# Altium schematic symbol library 724452_RPL-HX_Mobile_AEP_Rev0p91_Library.SchLib: 162 symbols (part 4 of 5)
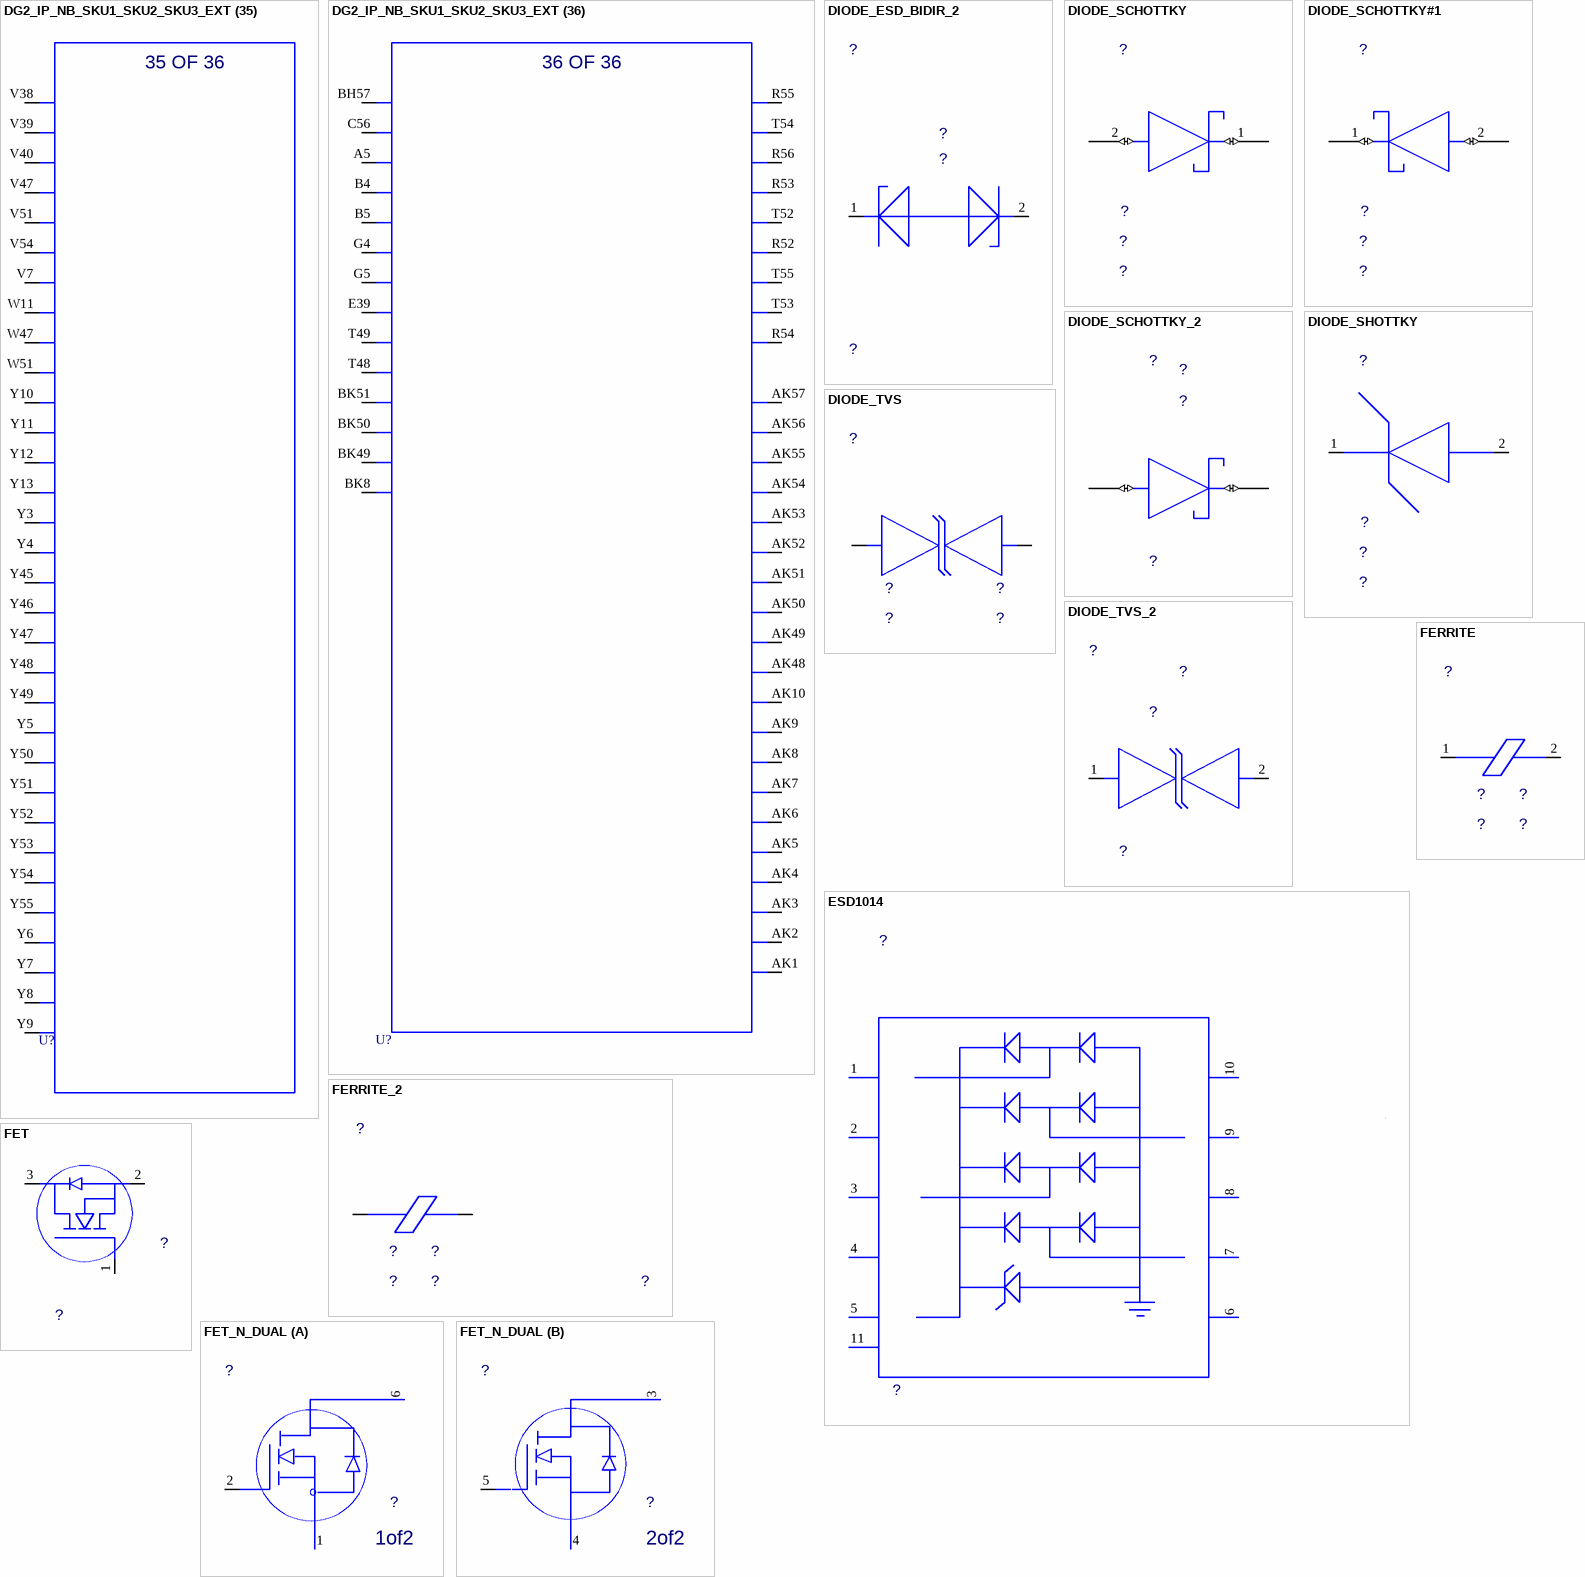
[diagram p46: symbols DG2_IP_NB_SKU1_SKU2_SKU3_EXT to FET_N_DUAL]
## DG2_IP_NB_SKU1_SKU2_SKU3_EXT
designator U?  (value not drawn)
CDS_LMAN_SYM_OUTLINE: -300,850,300,-800; OriginalSymbolOrigin: (-325,850)
part A pins: A8 PCIE_RX_N_14 (io), A10 PCIE_RX_N_12 (io), A12 PCIE_RX_N_10 (io), A14 PCIE_RX_N_8 (io), A16 PCIE_RX_N_6 (io), A18 PCIE_RX_N_4 (io), A20 PCIE_RX_N_2 (io), A22 PCIE_RX_N_0 (io), B7 PCIE_RX_N_15 (io), B8 PCIE_RX_P_14 (io), B9 PCIE_RX_N_13 (io), B10 PCIE_RX_P_12 (io), B11 PCIE_RX_N_11 (io), B12 PCIE_RX_P_10 (io), B13 PCIE_RX_N_9 (io), B14 PCIE_RX_P_8 (io), B15 PCIE_RX_N_7 (io), B16 PCIE_RX_P_6 (io), B17 PCIE_RX_N_5 (io), B18 PCIE_RX_P_4 (io), B19 PCIE_RX_N_3 (io), B20 PCIE_RX_P_2 (io), B21 PCIE_RX_N_1 (io), B22 PCIE_RX_P_0 (io), B41 PERST# (io), C7 PCIE_RX_P_15 (io), C9 PCIE_RX_P_13 (io), C11 PCIE_RX_P_11 (io), C13 PCIE_RX_P_9 (io), C15 PCIE_RX_P_7 (io), C17 PCIE_RX_P_5 (io), C19 PCIE_RX_P_3 (io), C21 PCIE_RX_P_1 (io), C24 PCIE_REF_CLK_N (io), C41 CLKREQ# (io), D24 PCIE_REF_CLK_P (io), D40 WAKE# (io), E7 PCIE_TX_N_15 (io), E9 PCIE_TX_N_13 (io), E11 PCIE_TX_N_11 (io), E13 PCIE_TX_N_9 (io), E15 PCIE_TX_N_7 (io), E17 PCIE_TX_N_5 (io), E19 PCIE_TX_N_3 (io), E21 PCIE_TX_N_1 (io), F7 PCIE_TX_P_15 (io), F8 PCIE_TX_N_14 (io), F9 PCIE_TX_P_13 (io), F10 PCIE_TX_N_12 (io), F11 PCIE_TX_P_11 (io), F12 PCIE_TX_N_10 (io), F13 PCIE_TX_P_9 (io), F14 PCIE_TX_N_8 (io), F15 PCIE_TX_P_7 (io), F16 PCIE_TX_N_6 (io), F17 PCIE_TX_P_5 (io), F18 PCIE_TX_N_4 (io), F19 PCIE_TX_P_3 (io), F20 PCIE_TX_N_2 (io), F21 PCIE_TX_P_1 (io), F22 PCIE_TX_N_0 (io), F24 PCIE_SMB_DATA (io), G8 PCIE_TX_P_14 (io), G10 PCIE_TX_P_12 (io), G12 PCIE_TX_P_10 (io), G14 PCIE_TX_P_8 (io), G16 PCIE_TX_P_6 (io), G18 PCIE_TX_P_4 (io), G20 PCIE_TX_P_2 (io), G22 PCIE_TX_P_0 (io), G24 PCIE_SMB_CLK (io)
part B pins: A37 DP_HPDA# (io), E55 DDCA_SDA (io), E56 DDCA_SCL (io), F39 PANEL_VDDEN (io), F56 DDIA_TXN3 (io), F57 DDIA_TXP3 (io), G38 DISP_UTILS0 (io), G39 PANEL_BKLTCTL (io), G55 DDIA_TXN2 (io), G56 DDIA_TXP2 (io), H38 DISP_UTILS1 (io), H39 PANEL_BKLTEN (io), H56 DDIA_TXN1 (io), H57 DDIA_TXP1 (io), J55 DDIA_TXN0 (io), J56 DDIA_TXP0 (io), K56 DDIA_AUX_N (io), K57 DDIA_AUX_P (io)
part C pins: B37 DP_HPDB# (io), E51 DDIB_TXN3 (io), E52 DDIB_TXP3 (io), F52 DDIB_TXN2 (io), F53 DDIB_TXP2 (io), G51 DDIB_TXN1 (io), G52 DDIB_TXP1 (io), H52 DDIB_TXN0 (io), H53 DDIB_TXP0 (io), J51 DDIB_AUX_N (io), J52 DDIB_AUX_P (io), K52 DDCB_SCL (io), K53 DDCB_SDA (io)
part D pins: A49 DDIC_TXP3 (io), A51 DDIC_TXP1 (io), A53 DDIC_AUX_P (io), B48 DDCC_SCL (io), B49 DDIC_TXN3 (io), B50 DDIC_TXP2 (io), B51 DDIC_TXN1 (io), B52 DDIC_TXP0 (io), B53 DDIC_AUX_N (io), C37 DP_HPDC# (io), C48 DDCC_SDA (io), C50 DDIC_TXN2 (io), C52 DDIC_TXN0 (io)
part E pins: E37 DP_HPDD# (io), E44 DDID_TXP3 (io), E46 DDID_TXP1 (io), E48 DDID_AUX_P (io), F44 DDID_TXN3 (io), F45 DDID_TXP2 (io), F46 DDID_TXN1 (io), F47 DDID_TXP0 (io), F48 DDID_AUX_N (io), F49 DDCD_SCL (io), G45 DDID_TXN2 (io), G47 DDID_TXN0 (io), G49 DDCD_SDA (io)
part F pins: A26 RSVD_45 (io), A29 DDIE_AUX_P (io), A31 DDIE_TXP0 (io), A33 DDIE_TXP2 (io), A38 RSVD_46 (io), B28 DDCE_SCL (io), B29 DDIE_AUX_N (io), B30 DDIE_TXP1 (io), B31 DDIE_TXN0 (io), B32 DDIE_TXP3 (io), B33 DDIE_TXN2 (io), B38 RSVD_47 (io), B39 RSVD_48 (io), C28 DDCE_SDA (io), C30 DDIE_TXN1 (io), C32 DDIE_TXN3 (io), C39 RSVD_51 (io), D38 RSVD_50 (io), E38 RSVD_49 (io), F37 DP_HPDE# (io)
part G pins: A24 RSVD_39 (io), C26 RSVD_40 (io), D26 RSVD_41 (io), F26 RSVD_42 (io), G26 RSVD_43 (io), H37 RSVD_44 (io)
part H pins: E28 RSVD_53 (io), F28 RSVD_52 (io), H27 RSVD_55 (io), H28 RSVD_54 (io)
part I pins: BA42 GDDR_C0_B_DQ14 (io), BA43 GDDR_C0_B_DQ9 (io), BA45 GDDR_C0_A_DQ13 (io), BA46 GDDR_C0_A_DQ15 (io), BB42 GDDR_C0_B_DQ11 (io), BB43 GDDR_C0_B_DQ8 (io), BB45 GDDR_C0_A_DQ14 (io), BB46 GDDR_C0_A_DQ11 (io), BC42 GDDR_C0_B_DQ10 (io), BC43 GDDR_C0_B_EDC1 (io), BC45 GDDR_C0_A_DQ12 (io), BC46 GDDR_C0_A_DQ8 (io), BC56 GDDR_C0_A_CABI_N (io), BD43 GDDR_C0_B_DQ13 (io), BD48 GDDR_C0_B_DQ6 (io), BD49 GDDR_C0_B_DQ1 (io), BD50 GDDR_C0_B_EDC0 (io), BD52 GDDR_C0_B_DQ2 (io), BD53 GDDR_C0_B_DBI0_N (io), BD55 GDDR_C0_A_CA8 (io), BD56 GDDR_C0_A_CA4 (io), BD57 GDDR_C0_A_CA0 (io), BE42 GDDR_C0_B_DQ15 (io), BE43 GDDR_C0_B_DQ12 (io), BE45 GDDR_C0_A_DQ10 (io), BE46 GDDR_C0_A_DQ9 (io), BE48 GDDR_C0_B_DQ7 (io), BE49 GDDR_C0_B_DQ5 (io), BE50 GDDR_C0_B_DQ4 (io), BE52 GDDR_C0_B_DQ3 (io), BE53 GDDR_C0_B_DQ0 (io), BE54 GDDR_C0_B_WCK0_DP (io), BE55 GDDR_C0_B_WCK0_DN (io), BE56 GDDR_C0_A_CA9 (io), BE57 GDDR_C0_A_CA2 (io), BF42 GDDR_C0_RESET_N (io), BF43 GDDR_C0_B_DBI1_N (io), BF45 GDDR_C0_A_EDC1 (io), BF46 GDDR_C0_A_DBI1_N (io), BF56 GDDR_RCOMP_A (io), BG42 GDDR_C0_B_WCK1_DP (io), BG43 GDDR_C0_A_CA3 (io), BG45 GDDR_C0_A_WCK1_DN (io), BG46 GDDR_C0_B_CA5 (io), BG48 GDDR_C0_A_DQ1 (io), BG49 GDDR_C0_A_DQ0 (io), BG50 GDDR_C0_A_EDC0 (io), BG51 GDDR_C0_A_DQ5 (io), BG52 GDDR_C0_A_DQ7 (io), BG53 GDDR_C0_A_DQ6 (io), BG54 GDDR_C0_B_CA4 (io), BG55 GDDR_C0_B_CA2 (io), BG56 GDDR_C0_B_CA0 (io), BH42 GDDR_C0_B_WCK1_DN (io), BH43 GDDR_C0_A_CA6 (io), BH45 GDDR_C0_A_WCK1_DP (io), BH46 GDDR_C0_B_CA7 (io), BH48 GDDR_C0_A_DBI0_N (io), BH49 GDDR_C0_A_DQ4 (io), BH50 GDDR_C0_A_DQ2 (io), BH52 GDDR_C0_A_DQ3 (io), BH54 GDDR_C0_A_WCK0_DN (io), BH55 GDDR_C0_A_WCK0_DP (io), BH56 GDDR_C0_B_CA8 (io), BJ42 GDDR_C0_A_CA7 (io), BJ43 GDDR_C0_A_CA1 (io), BJ44 GDDR_C0_B_CA1 (io), BJ45 GDDR_C0_B_CKE_N (io), BJ46 GDDR_C0_CK_DN (io), BJ47 GDDR_C0_B_CA6 (io), BK42 GDDR_C0_A_CA5 (io), BK43 GDDR_C0_A_CKE_N (io), BK45 GDDR_C0_B_CA3 (io), BK46 GDDR_C0_CK_DP (io), BK52 GDDR_C0_B_CA9 (io), BK53 GDDR_C0_B_CABI_N (io)
part J pins: BA30 GDDR_C1_B_DQ14 (io), BA31 GDDR_C1_B_DQ9 (io), BA33 GDDR_C1_A_DQ13 (io), BA34 GDDR_C1_A_DQ15 (io), BA36 GDDR_C1_A_DQ4 (io), BA37 GDDR_C1_A_DQ1 (io), BA39 GDDR_C1_B_DQ7 (io), BA40 GDDR_C1_B_DQ6 (io), BB30 GDDR_C1_B_DQ11 (io), BB31 GDDR_C1_B_DQ8 (io), BB33 GDDR_C1_A_DQ14 (io), BB34 GDDR_C1_A_DQ11 (io), BB36 GDDR_C1_A_DQ3 (io), BB37 GDDR_C1_A_DQ0 (io), BB39 GDDR_C1_B_DQ5 (io), BB40 GDDR_C1_B_DQ1 (io), BC30 GDDR_C1_B_DQ10 (io), BC31 GDDR_C1_B_EDC1 (io), BC33 GDDR_C1_A_DQ12 (io), BC34 GDDR_C1_A_DQ8 (io), BC36 GDDR_C1_A_DQ2 (io), BC37 GDDR_C1_A_DBI0_N (io), BC39 GDDR_C1_B_DQ4 (io), BC40 GDDR_C1_B_EDC0 (io), BD31 GDDR_C1_B_DQ13 (io), BD37 GDDR_C1_A_DQ5 (io), BE30 GDDR_C1_B_DQ15 (io), BE31 GDDR_C1_B_DQ12 (io), BE33 GDDR_C1_A_DQ9 (io), BE34 GDDR_C1_A_DQ10 (io), BE36 GDDR_C1_A_DQ7 (io), BE37 GDDR_C1_A_DQ6 (io), BE39 GDDR_C1_B_DQ3 (io), BE40 GDDR_C1_B_DQ2 (io), BF30 GDDR_C1_RESET_N (io), BF31 GDDR_C1_B_DBI1_N (io), BF33 GDDR_C1_A_EDC1 (io), BF34 GDDR_C1_A_DBI1_N (io), BF37 GDDR_C1_A_EDC0 (io), BF39 GDDR_C1_B_DQ0 (io), BF40 GDDR_C1_B_DBI0_N (io), BG30 GDDR_C1_B_WCK1_DP (io), BG31 GDDR_C1_A_CA3 (io), BG33 GDDR_C1_A_WCK1_DN (io), BG34 GDDR_C1_B_CA5 (io), BG36 GDDR_C1_A_WCK0_DP (io), BG37 GDDR_C1_B_CA8 (io), BG39 GDDR_C1_B_WCK0_DN (io), BH30 GDDR_C1_B_WCK1_DN (io), BH31 GDDR_C1_A_CA6 (io), BH33 GDDR_C1_A_WCK1_DP (io), BH34 GDDR_C1_B_CA7 (io), BH36 GDDR_C1_A_WCK0_DN (io), BH37 GDDR_C1_B_CA0 (io), BH39 GDDR_C1_B_WCK0_DP (io), BH40 GDDR_C1_A_CA8 (io), BJ30 GDDR_C1_A_CA7 (io), BJ31 GDDR_C1_A_CA1 (io), BJ32 GDDR_C1_B_CA1 (io), BJ33 GDDR_C1_B_CKE_N (io), BJ34 GDDR_C1_CK_DP (io), BJ35 GDDR_C1_B_CA6 (io), BJ36 GDDR_C1_B_CA9 (io), BJ37 GDDR_C1_B_CA4 (io), BJ38 GDDR_C1_B_CA2 (io), BJ39 GDDR_C1_A_CA9 (io), BJ40 GDDR_C1_A_CA4 (io), BJ41 GDDR_C1_A_CABI_N (io), BK30 GDDR_C1_A_CA5 (io), BK31 GDDR_C1_A_CKE_N (io), BK33 GDDR_C1_B_CA3 (io), BK34 GDDR_C1_CK_DN (io), BK36 GDDR_C1_B_CABI_N (io), BK37 GDDR_RCOMP_B (io), BK39 GDDR_C1_A_CA2 (io), BK40 GDDR_C1_A_CA0 (io)
part K pins: AA48 GDDR_C2_A_DQ1 (io), AA49 GDDR_C2_A_DQ0 (io), AA50 GDDR_C2_A_DBI0_N (io), AA51 GDDR_C2_A_DQ5 (io), AA52 GDDR_C2_A_DQ6 (io), AA53 GDDR_C2_A_EDC0 (io), AA54 GDDR_C2_B_CA8 (io), AA55 GDDR_C2_B_CA0 (io), AA56 GDDR_C2_B_CA4 (io), AA57 GDDR_RCOMP_C (io), AB48 GDDR_C2_A_DQ4 (io), AB49 GDDR_C2_A_DQ3 (io), AB50 GDDR_C2_A_DQ2 (io), AB52 GDDR_C2_A_DQ7 (io), AB54 GDDR_C2_A_WCK0_DP (io), AB55 GDDR_C2_A_WCK0_DN (io), AB56 GDDR_C2_B_CA9 (io), AB57 GDDR_C2_B_CABI_N (io), AC56 GDDR_C2_B_CA6 (io), AD48 GDDR_C2_A_DQ15 (io), AD49 GDDR_C2_A_DQ11 (io), AD50 GDDR_C2_A_DQ8 (io), AD52 GDDR_C2_A_DQ10 (io), AD53 GDDR_C2_A_DBI1_N (io), AD54 GDDR_C2_B_CA5 (io), AD55 GDDR_C2_B_CA7 (io), AD56 GDDR_C2_CK_DP (io), AD57 GDDR_C2_CK_DN (io), AE48 GDDR_C2_A_DQ13 (io), AE49 GDDR_C2_A_DQ14 (io), AE50 GDDR_C2_A_DQ12 (io), AE52 GDDR_C2_A_DQ9 (io), AE53 GDDR_C2_A_EDC1 (io), AE54 GDDR_C2_A_WCK1_DN (io), AE55 GDDR_C2_A_WCK1_DP (io), AE56 GDDR_C2_B_CKE_N (io), AE57 GDDR_C2_B_CA3 (io), AF56 GDDR_C2_B_CA1 (io), AG48 GDDR_C2_B_DQ9 (io), AG49 GDDR_C2_B_DQ8 (io), AG50 GDDR_C2_B_EDC1 (io), AG51 GDDR_C2_B_DQ13 (io), AG52 GDDR_C2_B_DQ12 (io), AG53 GDDR_C2_B_DBI1_N (io), AG54 GDDR_C2_A_CA3 (io), AG55 GDDR_C2_A_CA6 (io), AG56 GDDR_C2_A_CA1 (io), AG57 GDDR_C2_A_CKE_N (io), AH48 GDDR_C2_B_DQ14 (io), AH49 GDDR_C2_B_DQ11 (io), AH50 GDDR_C2_B_DQ10 (io), AH52 GDDR_C2_B_DQ15 (io), AH53 GDDR_C2_RESET_N (io), AH54 GDDR_C2_B_WCK1_DN (io), AH55 GDDR_C2_B_WCK1_DP (io), AH56 GDDR_C2_A_CA7 (io), AH57 GDDR_C2_A_CA5 (io), U56 GDDR_C2_A_CABI_N (io), V48 GDDR_C2_B_DQ6 (io), V49 GDDR_C2_B_DQ1 (io), V50 GDDR_C2_B_EDC0 (io), V52 GDDR_C2_B_DQ2 (io), V53 GDDR_C2_B_DBI0_N (io), V55 GDDR_C2_A_CA8 (io), V56 GDDR_C2_A_CA4 (io), V57 GDDR_C2_A_CA0 (io), W48 GDDR_C2_B_DQ7 (io), W49 GDDR_C2_B_DQ5 (io), W50 GDDR_C2_B_DQ4 (io), W52 GDDR_C2_B_DQ3 (io), W53 GDDR_C2_B_DQ0 (io), W54 GDDR_C2_B_WCK0_DN (io), W55 GDDR_C2_B_WCK0_DP (io), W56 GDDR_C2_A_CA9 (io), W57 GDDR_C2_A_CA2 (io), Y56 GDDR_C2_B_CA2 (io)
part L pins: AL56 GDDR_C3_A_CABI_N (io), AM48 GDDR_C3_B_DQ6 (io), AM49 GDDR_C3_B_DQ1 (io), AM50 GDDR_C3_B_EDC0 (io), AM52 GDDR_C3_B_DQ2 (io), AM53 GDDR_C3_B_DBI0_N (io), AM55 GDDR_C3_A_CA8 (io), AM56 GDDR_C3_A_CA4 (io), AM57 GDDR_C3_A_CA0 (io), AN48 GDDR_C3_B_DQ7 (io), AN49 GDDR_C3_B_DQ5 (io), AN50 GDDR_C3_B_DQ4 (io), AN52 GDDR_C3_B_DQ3 (io), AN53 GDDR_C3_B_DQ0 (io), AN54 GDDR_C3_B_WCK0_DN (io), AN55 GDDR_C3_B_WCK0_DP (io), AN56 GDDR_C3_A_CA9 (io), AN57 GDDR_C3_A_CA2 (io), AP56 GDDR_C3_B_CA2 (io), AR48 GDDR_C3_A_DQ1 (io), AR49 GDDR_C3_A_DQ0 (io), AR50 GDDR_C3_A_DBI0_N (io), AR51 GDDR_C3_A_DQ5 (io), AR52 GDDR_C3_A_DQ6 (io), AR53 GDDR_C3_A_EDC0 (io), AR54 GDDR_C3_B_CA8 (io), AR55 GDDR_C3_B_CA0 (io), AR56 GDDR_C3_B_CA4 (io), AR57 GDDR_RCOMP_D (io), AT48 GDDR_C3_A_DQ4 (io), AT49 GDDR_C3_A_DQ3 (io), AT50 GDDR_C3_A_DQ2 (io), AT52 GDDR_C3_A_DQ7 (io), AT54 GDDR_C3_A_WCK0_DP (io), AT55 GDDR_C3_A_WCK0_DN (io), AT56 GDDR_C3_B_CA9 (io), AT57 GDDR_C3_B_CABI_N (io), AU56 GDDR_C3_B_CA6 (io), AV48 GDDR_C3_A_DQ15 (io), AV49 GDDR_C3_A_DQ11 (io), AV50 GDDR_C3_A_DQ8 (io), AV52 GDDR_C3_A_DQ10 (io), AV53 GDDR_C3_A_DBI1_N (io), AV54 GDDR_C3_B_CA5 (io), AV55 GDDR_C3_B_CA7 (io), AV56 GDDR_C3_CK_DP (io), AV57 GDDR_C3_CK_DN (io), AW48 GDDR_C3_A_DQ13 (io), AW49 GDDR_C3_A_DQ14 (io), AW50 GDDR_C3_A_DQ12 (io), AW52 GDDR_C3_A_DQ9 (io), AW53 GDDR_C3_A_EDC1 (io), AW54 GDDR_C3_A_WCK1_DN (io), AW55 GDDR_C3_A_WCK1_DP (io), AW56 GDDR_C3_B_CKE_N (io), AW57 GDDR_C3_B_CA3 (io), AY56 GDDR_C3_B_CA1 (io), BA48 GDDR_C3_B_DQ9 (io), BA49 GDDR_C3_B_DQ8 (io), BA50 GDDR_C3_B_EDC1 (io), BA51 GDDR_C3_B_DQ13 (io), BA52 GDDR_C3_B_DQ12 (io), BA53 GDDR_C3_B_DBI1_N (io), BA54 GDDR_C3_A_CA3 (io), BA55 GDDR_C3_A_CA6 (io), BA56 GDDR_C3_A_CA1 (io), BA57 GDDR_C3_A_CKE_N (io), BB48 GDDR_C3_B_DQ14 (io), BB49 GDDR_C3_B_DQ11 (io), BB50 GDDR_C3_B_DQ10 (io), BB52 GDDR_C3_B_DQ15 (io), BB53 GDDR_C3_RESET_N (io), BB54 GDDR_C3_B_WCK1_DN (io), BB55 GDDR_C3_B_WCK1_DP (io), BB56 GDDR_C3_A_CA7 (io), BB57 GDDR_C3_A_CA5 (io)
part M pins: AA1 GDDR_C4_A_CA0 (io), AA2 GDDR_C4_A_CA2 (io), AA3 GDDR_C4_A_WCK0_DN (io), AA4 GDDR_C4_A_WCK0_DP (io), AA5 GDDR_C4_A_EDC0 (io), AA6 GDDR_C4_A_DQ5 (io), AA8 GDDR_C4_A_DQ4 (io), AA9 GDDR_C4_A_DQ1 (io), AA10 GDDR_C4_A_DQ2 (io), AB1 GDDR_C4_CK_DP (io), AB2 GDDR_C4_CK_DN (io), AB4 GDDR_C4_A_CA4 (io), AB5 GDDR_C4_A_DBI0_N (io), AB6 GDDR_C4_A_DQ3 (io), AB8 GDDR_C4_A_DQ7 (io), AB9 GDDR_C4_A_DQ6 (io), AB10 GDDR_C4_A_DQ0 (io), AC2 GDDR_C4_A_CA8 (io), AD1 GDDR_C4_A_CA9 (io), AD2 GDDR_C4_A_CABI_N (io), AD3 GDDR_C4_A_WCK1_DP (io), AD4 GDDR_C4_A_WCK1_DN (io), AD6 GDDR_C4_A_DQ11 (io), AD8 GDDR_C4_A_DQ13 (io), AD9 GDDR_C4_A_DBI1_N (io), AD10 GDDR_C4_A_DQ9 (io), AE1 GDDR_C4_A_CA7 (io), AE2 GDDR_C4_A_CA5 (io), AE3 GDDR_C4_A_CA3 (io), AE4 GDDR_C4_A_CA6 (io), AE5 GDDR_C4_A_EDC1 (io), AE6 GDDR_C4_A_DQ8 (io), AE7 GDDR_C4_A_DQ10 (io), AE8 GDDR_C4_A_DQ14 (io), AE9 GDDR_C4_A_DQ12 (io), AE10 GDDR_C4_A_DQ15 (io), AF2 GDDR_C4_A_CKE_N (io), AG1 GDDR_C4_B_CA6 (io), AG2 GDDR_C4_A_CA1 (io), AG3 GDDR_C4_B_WCK1_DN (io), AG4 GDDR_C4_B_WCK1_DP (io), AG5 GDDR_C4_B_DQ15 (io), AG6 GDDR_C4_B_DQ14 (io), AG8 GDDR_C4_B_DQ10 (io), AG9 GDDR_C4_B_DQ8 (io), AG10 GDDR_C4_B_DQ9 (io), AH1 GDDR_C4_B_CKE_N (io), AH2 GDDR_C4_B_CA3 (io), AH3 GDDR_C4_B_CA5 (io), AH4 GDDR_C4_B_CA1 (io), AH5 GDDR_C4_B_DQ11 (io), AH6 GDDR_C4_B_DQ13 (io), AH8 GDDR_C4_B_EDC1 (io), AH9 GDDR_C4_B_DBI1_N (io), AH10 GDDR_C4_B_DQ12 (io), AJ2 GDDR_C4_B_CA7 (io), V1 GDDR_C4_B_CA8 (io), V2 GDDR_C4_B_CABI_N (io), V3 GDDR_C4_B_WCK0_DN (io), V4 GDDR_C4_B_WCK0_DP (io), V5 GDDR_C4_RESET_N (io), V6 GDDR_C4_B_DQ0 (io), V8 GDDR_C4_B_DQ5 (io), V9 GDDR_C4_B_EDC0 (io), V10 GDDR_C4_B_DQ1 (io), W1 GDDR_RCOMP_E (io), W2 GDDR_C4_B_CA0 (io), W3 GDDR_C4_B_CA2 (io), W4 GDDR_C4_B_CA4 (io), W5 GDDR_C4_B_DBI0_N (io), W6 GDDR_C4_B_DQ2 (io), W7 GDDR_C4_B_DQ4 (io), W8 GDDR_C4_B_DQ3 (io), W9 GDDR_C4_B_DQ6 (io), W10 GDDR_C4_B_DQ7 (io), Y2 GDDR_C4_B_CA9 (io)
part N pins: AM1 GDDR_C5_B_CA8 (io), AM2 GDDR_C5_B_CABI_N (io), AM3 GDDR_C5_B_WCK0_DN (io), AM4 GDDR_C5_B_WCK0_DP (io), AM5 GDDR_C5_RESET_N (io), AM6 GDDR_C5_B_DQ0 (io), AM8 GDDR_C5_B_DQ5 (io), AM9 GDDR_C5_B_EDC0 (io), AM10 GDDR_C5_B_DQ1 (io), AN1 GDDR_RCOMP_F (io), AN2 GDDR_C5_B_CA0 (io), AN3 GDDR_C5_B_CA2 (io), AN4 GDDR_C5_B_CA4 (io), AN5 GDDR_C5_B_DBI0_N (io), AN6 GDDR_C5_B_DQ2 (io), AN7 GDDR_C5_B_DQ4 (io), AN8 GDDR_C5_B_DQ3 (io), AN9 GDDR_C5_B_DQ6 (io), AN10 GDDR_C5_B_DQ7 (io), AP2 GDDR_C5_B_CA9 (io), AR1 GDDR_C5_A_CA0 (io), AR2 GDDR_C5_A_CA2 (io), AR3 GDDR_C5_A_WCK0_DN (io), AR4 GDDR_C5_A_WCK0_DP (io), AR5 GDDR_C5_A_EDC0 (io), AR6 GDDR_C5_A_DQ5 (io), AR8 GDDR_C5_A_DQ4 (io), AR9 GDDR_C5_A_DQ1 (io), AR10 GDDR_C5_A_DQ2 (io), AT1 GDDR_C5_CK_DP (io), AT2 GDDR_C5_CK_DN (io), AT4 GDDR_C5_A_CA4 (io), AT5 GDDR_C5_A_DBI0_N (io), AT6 GDDR_C5_A_DQ3 (io), AT8 GDDR_C5_A_DQ7 (io), AT9 GDDR_C5_A_DQ6 (io), AT10 GDDR_C5_A_DQ0 (io), AU2 GDDR_C5_A_CA8 (io), AV1 GDDR_C5_A_CA9 (io), AV2 GDDR_C5_A_CABI_N (io), AV3 GDDR_C5_A_WCK1_DP (io), AV4 GDDR_C5_A_WCK1_DN (io), AV6 GDDR_C5_A_DQ11 (io), AV8 GDDR_C5_A_DQ13 (io), AV9 GDDR_C5_A_DBI1_N (io), AV10 GDDR_C5_A_DQ9 (io), AW1 GDDR_C5_A_CA7 (io), AW2 GDDR_C5_A_CA5 (io), AW3 GDDR_C5_A_CA3 (io), AW4 GDDR_C5_A_CA6 (io), AW5 GDDR_C5_A_EDC1 (io), AW6 GDDR_C5_A_DQ8 (io), AW7 GDDR_C5_A_DQ10 (io), AW8 GDDR_C5_A_DQ14 (io), AW9 GDDR_C5_A_DQ12 (io), AW10 GDDR_C5_A_DQ15 (io), AY2 GDDR_C5_A_CKE_N (io), BA1 GDDR_C5_B_CA6 (io), BA2 GDDR_C5_A_CA1 (io), BA3 GDDR_C5_B_WCK1_DN (io), BA4 GDDR_C5_B_WCK1_DP (io), BA5 GDDR_C5_B_DQ15 (io), BA6 GDDR_C5_B_DQ14 (io), BA8 GDDR_C5_B_DQ10 (io), BA9 GDDR_C5_B_DQ8 (io), BA10 GDDR_C5_B_DQ9 (io), BB1 GDDR_C5_B_CKE_N (io), BB2 GDDR_C5_B_CA3 (io), BB3 GDDR_C5_B_CA5 (io), BB4 GDDR_C5_B_CA1 (io), BB5 GDDR_C5_B_DQ11 (io), BB6 GDDR_C5_B_DQ13 (io), BB8 GDDR_C5_B_EDC1 (io), BB9 GDDR_C5_B_DBI1_N (io), BB10 GDDR_C5_B_DQ12 (io), BC2 GDDR_C5_B_CA7 (io)
part O pins: BA12 GDDR_C6_A_DQ9 (io), BA13 GDDR_C6_A_DQ15 (io), BA15 GDDR_C6_B_DQ9 (io), BA16 GDDR_C6_B_DQ12 (io), BB12 GDDR_C6_A_DBI1_N (io), BB13 GDDR_C6_A_DQ12 (io), BB15 GDDR_C6_B_DQ8 (io), BB16 GDDR_C6_B_DBI1_N (io), BC12 GDDR_C6_A_DQ13 (io), BC13 GDDR_C6_A_DQ14 (io), BC15 GDDR_C6_B_DQ10 (io), BC16 GDDR_C6_B_EDC1 (io), BD1 GDDR_C6_B_CA8 (io), BD2 GDDR_C6_B_CABI_N (io), BD3 GDDR_C6_B_WCK0_DP (io), BD4 GDDR_C6_B_WCK0_DN (io), BD5 GDDR_C6_RESET_N (io), BD6 GDDR_C6_B_DQ0 (io), BD8 GDDR_C6_B_DQ5 (io), BD9 GDDR_C6_B_EDC0 (io), BD10 GDDR_C6_B_DQ1 (io), BD13 GDDR_C6_A_DQ10 (io), BE1 GDDR_RCOMP_G (io), BE2 GDDR_C6_B_CA0 (io), BE3 GDDR_C6_B_CA2 (io), BE4 GDDR_C6_B_CA4 (io), BE5 GDDR_C6_B_DBI0_N (io), BE6 GDDR_C6_B_DQ2 (io), BE7 GDDR_C6_B_DQ4 (io), BE8 GDDR_C6_B_DQ3 (io), BE9 GDDR_C6_B_DQ6 (io), BE10 GDDR_C6_B_DQ7 (io), BE12 GDDR_C6_A_DQ11 (io), BE13 GDDR_C6_A_DQ8 (io), BE15 GDDR_C6_B_DQ14 (io), BE16 GDDR_C6_B_DQ13 (io), BF2 GDDR_C6_B_CA9 (io), BF13 GDDR_C6_A_EDC1 (io), BF15 GDDR_C6_B_DQ15 (io), BF16 GDDR_C6_B_DQ11 (io), BG2 GDDR_C6_A_CA2 (io), BG3 GDDR_C6_A_WCK0_DN (io), BG4 GDDR_C6_A_WCK0_DP (io), BG5 GDDR_C6_A_DQ6 (io), BG6 GDDR_C6_A_DQ1 (io), BG8 GDDR_C6_A_DQ4 (io), BG9 GDDR_C6_A_DQ3 (io), BG10 GDDR_C6_A_DQ7 (io), BG12 GDDR_C6_A_WCK1_DN (io), BG13 GDDR_C6_A_CA6 (io), BG15 GDDR_C6_B_WCK1_DP (io), BG16 GDDR_C6_B_CA1 (io), BH3 GDDR_C6_A_CA0 (io), BH4 GDDR_C6_A_CA4 (io), BH5 GDDR_C6_A_EDC0 (io), BH6 GDDR_C6_A_DBI0_N (io), BH8 GDDR_C6_A_DQ2 (io), BH9 GDDR_C6_A_DQ0 (io), BH12 GDDR_C6_A_WCK1_DP (io), BH13 GDDR_C6_A_CA3 (io), BH15 GDDR_C6_B_WCK1_DN (io), BH16 GDDR_C6_B_CA5 (io), BJ11 GDDR_C6_A_CA8 (io), BJ12 GDDR_C6_A_CABI_N (io), BJ13 GDDR_C6_A_CA5 (io), BJ14 GDDR_C6_A_CKE_N (io), BJ15 GDDR_C6_A_CA1 (io), BJ16 GDDR_C6_B_CA3 (io), BJ17 GDDR_C6_B_CA7 (io), BK5 GDDR_C6_CK_DN (io), BK6 GDDR_C6_CK_DP (io), BK9 GDDR_C6_A_DQ5 (io), BK12 GDDR_C6_A_CA9 (io), BK13 GDDR_C6_A_CA7 (io), BK15 GDDR_C6_B_CA6 (io), BK16 GDDR_C6_B_CKE_N (io)
part P pins: BA18 GDDR_C7_B_DQ1 (io), BA19 GDDR_C7_B_DQ7 (io), BA21 GDDR_C7_A_DQ2 (io), BA22 GDDR_C7_A_DQ0 (io), BA24 GDDR_C7_A_DQ9 (io), BA25 GDDR_C7_A_DQ15 (io), BA27 GDDR_C7_B_DQ9 (io), BA28 GDDR_C7_B_DQ12 (io), BB18 GDDR_C7_B_EDC0 (io), BB19 GDDR_C7_B_DQ6 (io), BB21 GDDR_C7_A_DQ1 (io), BB22 GDDR_C7_A_DQ6 (io), BB24 GDDR_C7_A_DBI1_N (io), BB25 GDDR_C7_A_DQ12 (io), BB27 GDDR_C7_B_DQ8 (io), BB28 GDDR_C7_B_DBI1_N (io), BC18 GDDR_C7_B_DQ5 (io), BC19 GDDR_C7_B_DQ3 (io), BC21 GDDR_C7_A_DQ4 (io), BC22 GDDR_C7_A_DQ7 (io), BC24 GDDR_C7_A_DQ13 (io), BC25 GDDR_C7_A_DQ14 (io), BC27 GDDR_C7_B_DQ10 (io), BC28 GDDR_C7_B_EDC1 (io), BD19 GDDR_C7_B_DQ4 (io), BD25 GDDR_C7_A_DQ10 (io), BE18 GDDR_C7_B_DQ0 (io), BE19 GDDR_C7_B_DQ2 (io), BE21 GDDR_C7_A_DQ5 (io), BE22 GDDR_C7_A_DQ3 (io), BE24 GDDR_C7_A_DQ11 (io), BE25 GDDR_C7_A_DQ8 (io), BE27 GDDR_C7_B_DQ14 (io), BE28 GDDR_C7_B_DQ13 (io), BF18 GDDR_C7_RESET_N (io), BF19 GDDR_C7_B_DBI0_N (io), BF21 GDDR_C7_A_EDC0 (io), BF22 GDDR_C7_A_DBI0_N (io), BF25 GDDR_C7_A_EDC1 (io), BF27 GDDR_C7_B_DQ15 (io), BF28 GDDR_C7_B_DQ11 (io), BG18 GDDR_C7_B_WCK0_DN (io), BG19 GDDR_C7_B_CA4 (io), BG21 GDDR_C7_A_WCK0_DP (io), BG22 GDDR_C7_A_CA4 (io), BG24 GDDR_C7_A_WCK1_DN (io), BG25 GDDR_C7_A_CA6 (io), BG27 GDDR_C7_B_WCK1_DP (io), BG28 GDDR_C7_B_CA1 (io), BH18 GDDR_C7_B_WCK0_DP (io), BH19 GDDR_C7_B_CA2 (io), BH21 GDDR_C7_A_WCK0_DN (io), BH24 GDDR_C7_A_WCK1_DP (io), BH25 GDDR_C7_A_CA3 (io), BH27 GDDR_C7_B_WCK1_DN (io), BH28 GDDR_C7_B_CA5 (io), BJ18 GDDR_C7_B_CABI_N (io), BJ19 GDDR_C7_B_CA0 (io), BJ20 GDDR_C7_B_CA9 (io), BJ21 GDDR_C7_A_CA2 (io), BJ22 GDDR_C7_CK_DN (io), BJ23 GDDR_C7_A_CA8 (io), BJ24 GDDR_C7_A_CABI_N (io), BJ25 GDDR_C7_A_CA5 (io), BJ26 GDDR_C7_A_CKE_N (io), BJ27 GDDR_C7_A_CA1 (io), BJ28 GDDR_C7_B_CA3 (io), BJ29 GDDR_C7_B_CA7 (io), BK18 GDDR_C7_B_CA8 (io), BK19 GDDR_RCOMP_H (io), BK21 GDDR_C7_A_CA0 (io), BK22 GDDR_C7_CK_DP (io), BK24 GDDR_C7_A_CA9 (io), BK25 GDDR_C7_A_CA7 (io), BK27 GDDR_C7_B_CA6 (io), BK28 GDDR_C7_B_CKE_N (io)
part Q pins: A40 PROC_PREQ# (io), A42 TRST# (io), B40 PROC_PRDY# (io), B42 TCK (io), B43 TMS (io), BJ1 RSVD_TP_26 (io), BJ57 RSVD_TP_29 (io), BK1 RSVD_TP_28 (io), BK2 RSVD_TP_27 (io), BK56 RSVD_TP_31 (io), BK57 RSVD_TP_30 (io), C42 TDO (io), C43 TDI (io), D42 EAR# (io), E1 STRAP_3 (io), E30 CFG_5 (io), E31 CFG_STRB_1 (io), E32 CFG_0 (io), E33 CFG_7 (io), E34 CFG_1 (io), F1 STRAP_2 (io), F31 CFG_STRB_0 (io), F33 CFG_14 (io), F35 CFG_3 (io), G1 STRAP_1 (io), G2 STRAP_0 (io), G30 CFG_12 (io), G32 CFG_6 (io), G34 CFG_8 (io), G35 CFG_2 (io), H30 CFG_11 (io), H31 CFG_10 (io), H32 CFG_4 (io), H33 CFG_13 (io), H34 CFG_15 (io), H35 CFG_9 (io), R49 RSVD_TP_32 (io), R50 DAM_MODE# (io), R57 RSVD_TP_33 (io), T57 RSVD_TP_34 (io)
part R pins: A35 CRCLK_XTAL_OUT (io), A44 SPI_DATA_3 (io), A46 SPI_DATA_2 (io), B35 CRCLK_XTAL_IN (io), B44 SPI_DESC_OVRD# (io), B45 SPI_CLK (io), B46 SPI_DATA_1 (io), C35 VSSXOSCVSSA (io), C44 SPI_CS1# (io), C45 SPI_DATA_0 (io), C46 SPI_CS0# (io), D35 VCCXOSCVDDA (io)
part S pins: C2 MEM_SR_EN (io), C3 PHASE_DISTR_0 (io), D3 PHASE_DISTR_1 (io), D34 VCCSA_PWRGD (io), D36 DGVCC_POWERGOOD (io), E2 POWER_LEVEL_IND (io), E3 POWER_INTR_MON (io), E35 VCCDDR_PWRGD (io), E36 VCCGT_PWRGD (io), E40 RTD3_EN (io), E41 PWRMGMT_CLK (io), E42 VIDSCK (io), F41 PWRMGMT_ALERT (io), F42 VIDALERT# (io), G36 VCCIO_PWRGD (io), G41 PWRMGMT_DATA (io), G42 VIDSOUT (io), H36 VCCSAMC_PWRGD (io), T50 DYNAMIC_VOLTAGE_CTRL (io)
part T pins: A2 RSVD_34 (io), A3 RSVD_TP_25 (io), A55 RSVD_24 (io), A56 RSVD_27 (io), A57 RSVD_26 (io), B1 RSVD_31 (io), B2 RSVD_33 (io), B3 RSVD_32 (io), B55 RSVD_25 (io), B57 RSVD_23 (io), BK3 SKTOCC# (io), C1 RSVD_30 (io), C4 PWM2_CTRL (io), C5 PWM1_CTRL (io), C55 RSVD_28 (io), D1 RSVD_29 (io), D5 PROCHOT# (io), E4 THRMTRIP# (io), E5 PECI (io), F3 TACH1_CTRL (io), F5 CATERR# (io), G3 TACH2_CTRL (io), G40 RSVD_TP_22 (io), H24 RSVD_36 (io), H25 RSVD_35 (io), H40 RSVD_TP_21 (io), R48 HVM_MODE# (io), R51 RSVD_TP_23 (io), T51 RSVD_TP_24 (io)
part U pins: AA12 VCCGDDRA_1 (io), AA13 VCCGDDRA_2 (io), AA45 VCCGDDRA_3 (io), AA46 VCCGDDRA_4 (io), AB12 VCCGDDRA_5 (io), AB13 VCCGDDRA_6 (io), AB45 VCCGDDRA_7 (io), AB46 VCCGDDRA_8 (io), AC12 VCCGDDRA_9 (io), AC46 VCCGDDRA_10 (io), AP13 VCCGDDRA_11 (io), AP26 VCCGDDRA_12 (io), AP44 VCCGDDRA_13 (io), AR12 VCCGDDRA_14 (io), AR13 VCCGDDRA_15 (io), AR14 VCCGDDRA_16 (io), AR27 VCCGDDRA_17 (io), AR44 VCCGDDRA_18 (io), AR45 VCCGDDRA_19 (io), AR46 VCCGDDRA_20 (io), AT12 VCCGDDRA_21 (io), AT13 VCCGDDRA_22 (io), AT14 VCCGDDRA_23 (io), AT27 VCCGDDRA_24 (io), AT44 VCCGDDRA_25 (io), AT45 VCCGDDRA_26 (io), AT46 VCCGDDRA_27 (io), AU12 VCCGDDRA_28 (io), AU13 VCCGDDRA_29 (io), AU27 VCCGDDRA_30 (io), AU45 VCCGDDRA_31 (io), AU46 VCCGDDRA_32 (io), AV12 VCCGDDRA_33 (io), AV13 VCCGDDRA_34 (io), AV20 VCCGDDRA_35 (io), AV21 VCCGDDRA_36 (io), AV22 VCCGDDRA_37 (io), AV23 VCCGDDRA_38 (io), AV35 VCCGDDRA_39 (io), AV36 VCCGDDRA_40 (io), AV37 VCCGDDRA_41 (io), AV38 VCCGDDRA_42 (io), AV45 VCCGDDRA_43 (io), AV46 VCCGDDRA_44 (io), AW12 VCCGDDRA_45 (io), AW13 VCCGDDRA_46 (io), AW20 VCCGDDRA_47 (io), AW21 VCCGDDRA_48 (io), AW22 VCCGDDRA_49 (io), AW23 VCCGDDRA_50 (io), AW35 VCCGDDRA_51 (io), AW36 VCCGDDRA_52 (io), AW37 VCCGDDRA_53 (io), AW38 VCCGDDRA_54 (io), AW45 VCCGDDRA_55 (io), AW46 VCCGDDRA_56 (io)
part V pins: AC13 VCCGDDRP4_1 (io), AC45 VCCGDDRP2_1 (io), AD12 VCCGDDRP4_2 (io), AD13 VCCGDDRP4_3 (io), AD45 VCCGDDRP2_2 (io), AD46 VCCGDDRP2_3 (io), AE12 VCCGDDRP4_4 (io), AE13 VCCGDDRIO4_1 (io), AE45 VCCGDDRIO2_1 (io), AE46 VCCGDDRP2_4 (io), AF12 VCCGDDRIO4_2 (io), AF13 VCCGDDRIO4_3 (io), AF45 VCCGDDRIO2_2 (io), AF46 VCCGDDRIO2_3 (io), AG12 VCCGDDRIO4_4 (io), AG13 VCCGDDRIO4_5 (io), AG45 VCCGDDRIO2_4 (io), AG46 VCCGDDRIO2_5 (io), AH12 VCCGDDRIO4_6 (io), AH13 VCCGDDRIO5_1 (io), AH45 VCCGDDRIO3_1 (io), AH46 VCCGDDRIO2_6 (io), AJ12 VCCGDDRIO5_2 (io), AJ13 VCCGDDRIO5_3 (io), AJ45 VCCGDDRIO3_2 (io), AJ46 VCCGDDRIO3_3 (io), AK12 VCCGDDRIO5_4 (io), AK13 VCCGDDRIO5_5 (io), AK45 VCCGDDRIO3_4 (io), AK46 VCCGDDRIO3_5 (io), AL12 VCCGDDRIO5_6 (io), AL13 VCCGDDRP5_1 (io), AL45 VCCGDDRP3_1 (io), AL46 VCCGDDRIO3_6 (io), AM12 VCCGDDRP5_2 (io), AM13 VCCGDDRP5_3 (io), AM45 VCCGDDRP3_2 (io), AM46 VCCGDDRP3_3 (io), AN12 VCCGDDRP5_4 (io), AN46 VCCGDDRP3_4 (io), AP15 VCCGDDRP6_1 (io), AP16 VCCGDDRP6_2 (io), AP17 VCCGDDRIO6_1 (io), AP18 VCCGDDRIO6_2 (io), AP19 VCCGDDRIO6_3 (io), AP20 VCCGDDRIO7_1 (io), AP21 VCCGDDRIO7_2 (io), AP22 VCCGDDRIO7_3 (io), AP23 VCCGDDRP7_1 (io), AP24 VCCGDDRP7_2 (io), AP33 VCCGDDRP1_1 (io), AP34 VCCGDDRP1_2 (io), AP35 VCCGDDRIO1_1 (io), AP36 VCCGDDRIO1_2 (io), AP37 VCCGDDRIO1_3 (io), AP38 VCCGDDRIO0_1 (io), AP39 VCCGDDRIO0_2 (io), AP40 VCCGDDRIO0_3 (io), AP41 VCCGDDRP0_1 (io), AP42 VCCGDDRP0_2 (io), AR16 VCCGDDRP6_3 (io), AR17 VCCGDDRP6_4 (io), AR18 VCCGDDRIO6_4 (io), AR19 VCCGDDRIO6_5 (io), AR20 VCCGDDRIO6_6 (io), AR21 VCCGDDRIO7_4 (io), AR22 VCCGDDRIO7_5 (io), AR23 VCCGDDRIO7_6 (io), AR24 VCCGDDRP7_3 (io), AR25 VCCGDDRP7_4 (io), AR33 VCCGDDRP1_3 (io), AR34 VCCGDDRP1_4 (io), AR35 VCCGDDRIO1_4 (io), AR36 VCCGDDRIO1_5 (io), AR37 VCCGDDRIO1_6 (io), AR38 VCCGDDRIO0_4 (io), AR39 VCCGDDRIO0_5 (io), AR40 VCCGDDRIO0_6 (io), AR41 VCCGDDRP0_3 (io), AR42 VCCGDDRP0_4 (io), AT16 VCCGDDRP6_5 (io), AT17 VCCGDDRP6_6 (io), AT18 VCCGDDRIO6_7 (io), AT19 VCCGDDRIO6_8 (io), AT20 VCCGDDRIO6_9 (io), AT21 VCCGDDRIO7_7 (io), AT22 VCCGDDRIO7_8 (io), AT23 VCCGDDRIO7_9 (io), AT24 VCCGDDRP7_5 (io), AT25 VCCGDDRP7_6 (io), AT33 VCCGDDRP1_5 (io), AT34 VCCGDDRP1_6 (io), AT35 VCCGDDRIO1_7 (io), AT36 VCCGDDRIO1_8 (io), AT37 VCCGDDRIO1_9 (io), AT38 VCCGDDRIO0_7 (io), AT39 VCCGDDRIO0_8 (io), AT40 VCCGDDRIO0_9 (io), AT41 VCCGDDRP0_5 (io), AT42 VCCGDDRP0_6 (io)